# Altium footprint library klp.PcbLib: 436 footprints (part 15 of 28)
Each footprint in its own frame and in the unit in brackets; x right, y up, seen from the top. Pads: shape width x height; smd on the part's side, far side on the other; paste and mask are expansions set on the pad; w line width, h text height; cw(c..) or ccw(c..) is an arc to the next point about the centre after c.
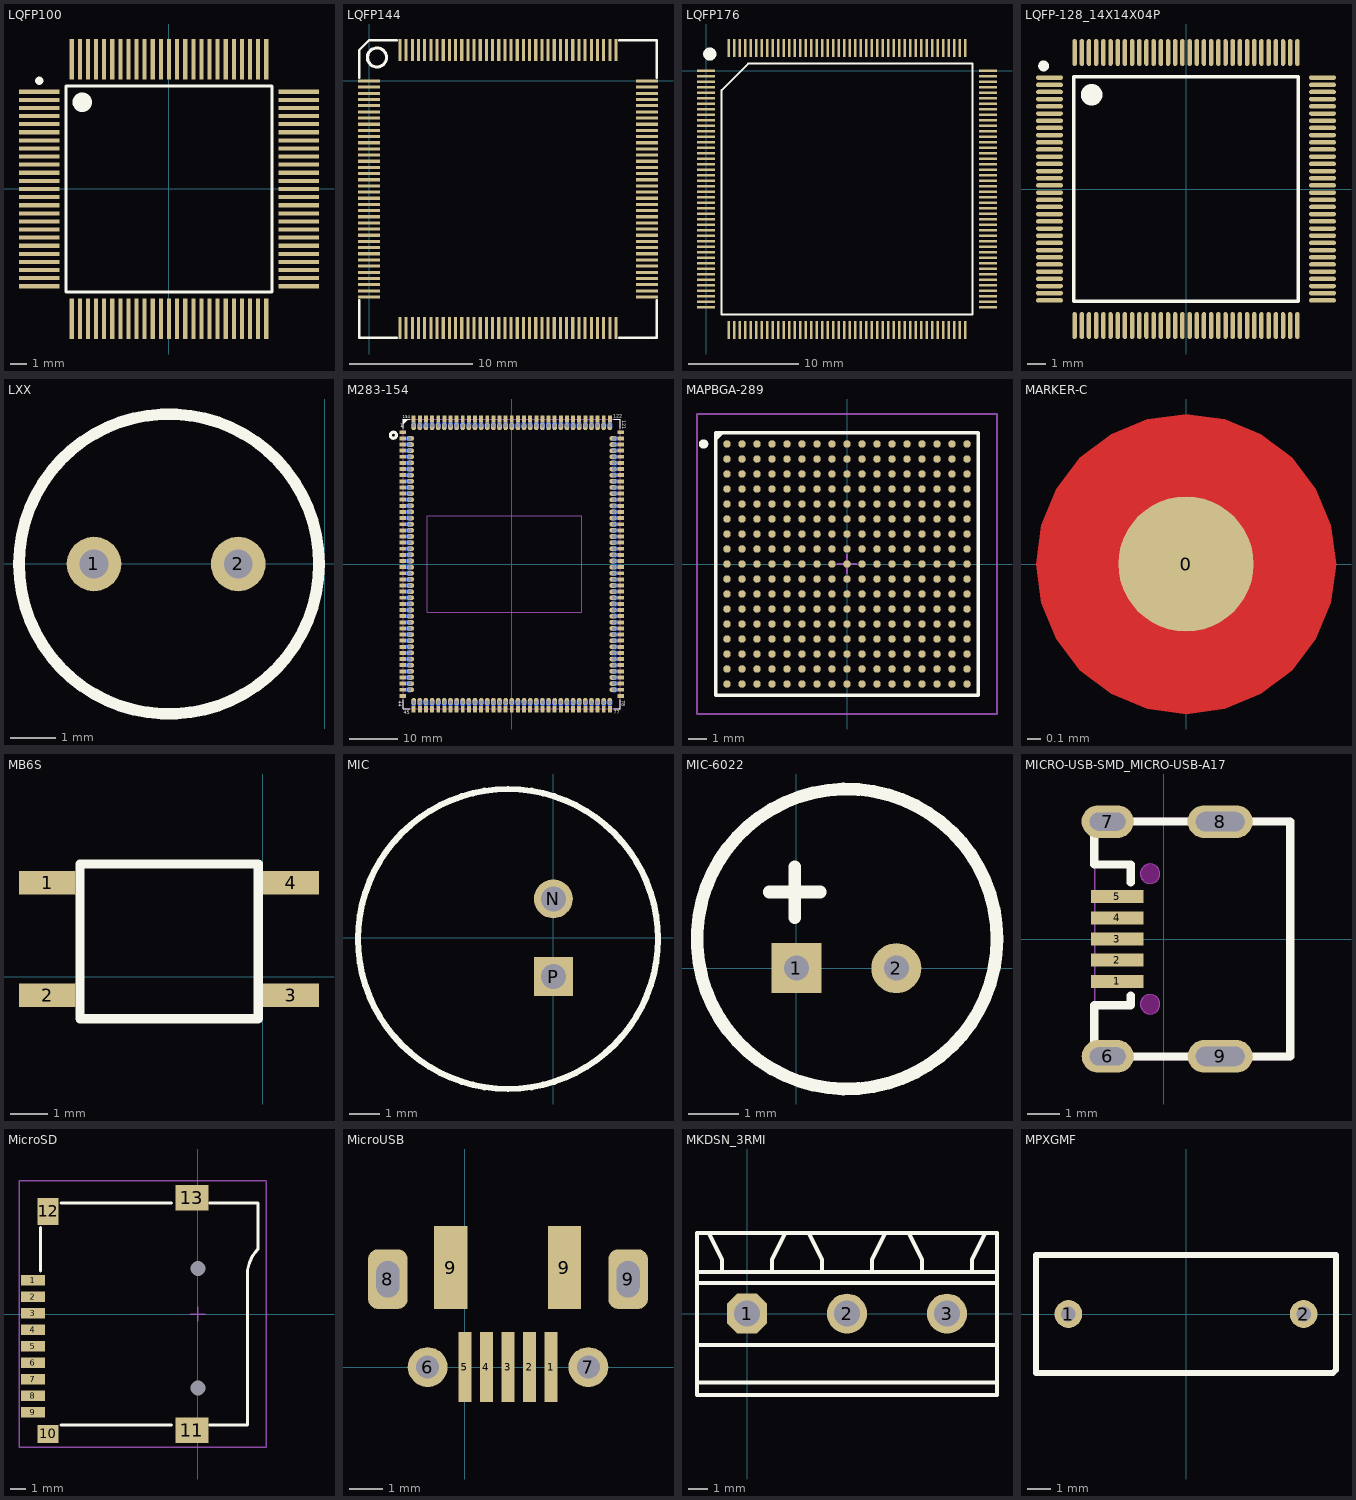
[diagram p14: the footprints below, top view; thin cyan lines are the x and y axes]

## LQFP100 [mm] "TSQFP, 100-Leads, Body 16.0x16.0mm (max), Pitch 0.50mm, IPC Medium Density"
height 1.5
pads (100):
  rect 2.5x0.254 smd: 1(-8,6) 2(-8,5.5) 3(-8,5) 4(-8,4.5) 5(-8,4) 6(-8,3.5) 7(-8,3) 8(-8,2.5) 9(-8,2) 10(-8,1.5) 11(-8,1) 12(-8,0.5) 13(-8,0) 14(-8,-0.5) 15(-8,-1) 16(-8,-1.5) 17(-8,-2) 18(-8,-2.5) 19(-8,-3) 20(-8,-3.5) 21(-8,-4) 22(-8,-4.5) 23(-8,-5) 24(-8,-5.5) 25(-8,-6) 51(8,-6) 52(8,-5.5) 53(8,-5) 54(8,-4.5) 55(8,-4) 56(8,-3.5) 57(8,-3) 58(8,-2.5) 59(8,-2) 60(8,-1.5) 61(8,-1) 62(8,-0.5) 63(8,0) 64(8,0.5) 65(8,1) 66(8,1.5) 67(8,2) 68(8,2.5) 69(8,3) 70(8,3.5) 71(8,4) 72(8,4.5) 73(8,5) 74(8,5.5) 75(8,6)
  rect 0.254x2.5 smd: 26(-6,-8) 27(-5.5,-8) 28(-5,-8) 29(-4.5,-8) 30(-4,-8) 31(-3.5,-8) 32(-3,-8) 33(-2.5,-8) 34(-2,-8) 35(-1.5,-8) 36(-1,-8) 37(-0.5,-8) 38(0,-8) 39(0.5,-8) 40(1,-8) 41(1.5,-8) 42(2,-8) 43(2.5,-8) 44(3,-8) 45(3.5,-8) 46(4,-8) 47(4.5,-8) 48(5,-8) 49(5.5,-8) 50(6,-8) 76(6,8) 77(5.5,8) 78(5,8) 79(4.5,8) 80(4,8) 81(3.5,8) 82(3,8) 83(2.5,8) 84(2,8) 85(1.5,8) 86(1,8) 87(0.5,8) 88(0,8) 89(-0.5,8) 90(-1,8) 91(-1.5,8) 92(-2,8) 93(-2.5,8) 94(-3,8) 95(-3.5,8) 96(-4,8) 97(-4.5,8) 98(-5,8) 99(-5.5,8) 100(-6,8)
Top Overlay:
  circle w0.6: c-5.35,5.35 r0.3
  circle w0.25: c-8,6.675 r0.125
  lines w0.2: -6.35,-6.35 6.35,-6.35 6.35,6.35 -6.35,6.35 -6.35,-6.35

## LQFP144 [mm]
pads (144):
  rect 1.8x0.254 smd: 1(-0.009,0.001) 2(-0.009,-0.499) 3(-0.009,-0.999) 4(-0.009,-1.499) 5(-0.009,-1.999) 6(-0.009,-2.499) 7(-0.009,-2.999) 8(-0.009,-3.499) 9(-0.009,-3.999) 10(-0.009,-4.499) 11(-0.009,-4.999) 12(-0.009,-5.499) 13(-0.009,-5.999) 14(-0.009,-6.499) 15(-0.009,-6.999) 16(-0.009,-7.499) 17(-0.009,-7.999) 18(-0.009,-8.499) 19(-0.009,-8.999) 20(-0.009,-9.499) 21(-0.009,-9.999) 22(-0.009,-10.499) 23(-0.009,-10.999) 24(-0.009,-11.499) 25(-0.009,-11.999) 26(-0.009,-12.499) 27(-0.009,-12.999) 28(-0.009,-13.499) 29(-0.009,-13.999) 30(-0.009,-14.499) 31(-0.009,-14.999) 32(-0.009,-15.499) 33(-0.009,-15.999) 34(-0.009,-16.499) 35(-0.009,-16.999) 36(-0.009,-17.499) 73(22.491,-17.499) 74(22.491,-16.999) 75(22.491,-16.499) 76(22.491,-15.999) 77(22.491,-15.499) 78(22.491,-14.999) 79(22.491,-14.499) 80(22.491,-13.999) 81(22.491,-13.499) 82(22.491,-12.999) 83(22.491,-12.499) 84(22.491,-11.999) 85(22.491,-11.499) 86(22.491,-10.999) 87(22.491,-10.499) 88(22.491,-9.999) 89(22.491,-9.499) 90(22.491,-8.999) 91(22.491,-8.499) 92(22.491,-7.999) 93(22.491,-7.499) 94(22.491,-6.999) 95(22.491,-6.499) 96(22.491,-5.999) 97(22.491,-5.499) 98(22.491,-4.999) 99(22.491,-4.499) 100(22.491,-3.999) 101(22.491,-3.499) 102(22.491,-2.999) 103(22.491,-2.499) 104(22.491,-1.999) 105(22.491,-1.499) 106(22.491,-0.999) 107(22.491,-0.499) 108(22.491,0.001)
  rect 0.254x1.8 smd: 37(2.491,-19.999) 38(2.991,-19.999) 39(3.491,-19.999) 40(3.991,-19.999) 41(4.491,-19.999) 42(4.991,-19.999) 43(5.491,-19.999) 44(5.991,-19.999) 45(6.491,-19.999) 46(6.991,-19.999) 47(7.491,-19.999) 48(7.991,-19.999) 49(8.491,-19.999) 50(8.991,-19.999) 51(9.491,-19.999) 52(9.991,-19.999) 53(10.491,-19.999) 54(10.991,-19.999) 55(11.491,-19.999) 56(11.991,-19.999) 57(12.491,-19.999) 58(12.991,-19.999) 59(13.491,-19.999) 60(13.991,-19.999) 61(14.491,-19.999) 62(14.991,-19.999) 63(15.491,-19.999) 64(15.991,-19.999) 65(16.491,-19.999) 66(16.991,-19.999) 67(17.491,-19.999) 68(17.991,-19.999) 69(18.491,-19.999) 70(18.991,-19.999) 71(19.491,-19.999) 72(19.991,-19.999) 109(19.991,2.501) 110(19.491,2.501) 111(18.991,2.501) 112(18.491,2.501) 113(17.991,2.501) 114(17.491,2.501) 115(16.991,2.501) 116(16.491,2.501) 117(15.991,2.501) 118(15.491,2.501) 119(14.991,2.501) 120(14.491,2.501) 121(13.991,2.501) 122(13.491,2.501) 123(12.991,2.501) 124(12.491,2.501) 125(11.991,2.501) 126(11.491,2.501) 127(10.991,2.501) 128(10.491,2.501) 129(9.991,2.501) 130(9.491,2.501) 131(8.991,2.501) 132(8.491,2.501) 133(7.991,2.501) 134(7.491,2.501) 135(6.991,2.501) 136(6.491,2.501) 137(5.991,2.501) 138(5.491,2.501) 139(4.991,2.501) 140(4.491,2.501) 141(3.991,2.501) 142(3.491,2.501) 143(2.991,2.501) 144(2.491,2.501)
Top Overlay:
  circle w0.254: c0.624,1.905 r0.773
  lines w0.2: -0.809,-17.749 -0.809,-20.799 2.241,-20.799 ; -0.809,0.251 -0.809,2.501 -0.009,3.301 2.241,3.301 ; 20.241,-20.799 23.291,-20.799 23.291,-17.749 ; 20.241,3.301 23.291,3.301 23.291,0.251

## LQFP176 [mm]
pads (176):
  rect 1.65x0.254 smd: 1(0,0) 2(0,-0.5) 3(0,-1) 4(0,-1.5) 5(0,-2) 6(0,-2.5) 7(0,-3) 8(0,-3.5) 9(0,-4) 10(0,-4.5) 11(0,-5) 12(0,-5.5) 13(0,-6) 14(0,-6.5) 15(0,-7) 16(0,-7.5) 17(0,-8) 18(0,-8.5) 19(0,-9) 20(0,-9.5) 21(0,-10) 22(0,-10.5) 23(0,-11) 24(0,-11.5) 25(0,-12) 26(0,-12.5) 27(0,-13) 28(0,-13.5) 29(0,-14) 30(0,-14.5) 31(0,-15) 32(0,-15.5) 33(0,-16) 34(0,-16.5) 35(0,-17) 36(0,-17.5) 37(0,-18) 38(0,-18.5) 39(0,-19) 40(0,-19.5) 41(0,-20) 42(0,-20.5) 43(0,-21) 44(0,-21.5) 89(25.631,-21.5) 90(25.631,-21) 91(25.631,-20.5) 92(25.631,-20) 93(25.631,-19.5) 94(25.631,-19) 95(25.631,-18.5) 96(25.631,-18) 97(25.631,-17.5) 98(25.631,-17) 99(25.631,-16.5) 100(25.631,-16) 101(25.631,-15.5) 102(25.631,-15) 103(25.631,-14.5) 104(25.631,-14) 105(25.631,-13.5) 106(25.631,-13) 107(25.631,-12.5) 108(25.631,-12) 109(25.631,-11.5) 110(25.631,-11) 111(25.631,-10.5) 112(25.631,-10) 113(25.631,-9.5) 114(25.631,-9) 115(25.631,-8.5) 116(25.631,-8) 117(25.631,-7.5) 118(25.631,-7) 119(25.631,-6.5) 120(25.631,-6) 121(25.631,-5.5) 122(25.631,-5) 123(25.631,-4.5) 124(25.631,-4) 125(25.631,-3.5) 126(25.631,-3) 127(25.631,-2.5) 128(25.631,-2) 129(25.631,-1.5) 130(25.631,-1) 131(25.631,-0.5) 132(25.631,0)
  rect 0.254x1.65 smd: 45(2.065,-23.566) 46(2.566,-23.566) 47(3.066,-23.566) 48(3.565,-23.566) 49(4.066,-23.566) 50(4.565,-23.566) 51(5.066,-23.566) 52(5.565,-23.566) 53(6.066,-23.566) 54(6.565,-23.566) 55(7.066,-23.566) 56(7.565,-23.566) 57(8.066,-23.566) 58(8.565,-23.566) 59(9.066,-23.566) 60(9.565,-23.566) 61(10.066,-23.566) 62(10.565,-23.566) 63(11.066,-23.566) 64(11.565,-23.566) 65(12.066,-23.566) 66(12.565,-23.566) 67(13.066,-23.566) 68(13.565,-23.566) 69(14.066,-23.566) 70(14.565,-23.566) 71(15.066,-23.566) 72(15.566,-23.566) 73(16.066,-23.566) 74(16.566,-23.566) 75(17.065,-23.566) 76(17.566,-23.566) 77(18.065,-23.566) 78(18.566,-23.566) 79(19.065,-23.566) 80(19.566,-23.566) 81(20.065,-23.566) 82(20.566,-23.566) 83(21.065,-23.566) 84(21.566,-23.566) 85(22.065,-23.566) 86(22.566,-23.566) 87(23.065,-23.566) 88(23.566,-23.566) 133(23.566,2.065) 134(23.065,2.065) 135(22.566,2.065) 136(22.065,2.065) 137(21.566,2.065) 138(21.065,2.065) 139(20.566,2.065) 140(20.065,2.065) 141(19.566,2.065) 142(19.065,2.065) 143(18.566,2.065) 144(18.065,2.065) 145(17.566,2.065) 146(17.065,2.065) 147(16.566,2.065) 148(16.066,2.065) 149(15.566,2.065) 150(15.066,2.065) 151(14.565,2.065) 152(14.066,2.065) 153(13.565,2.065) 154(13.066,2.065) 155(12.565,2.065) 156(12.066,2.065) 157(11.565,2.065) 158(11.066,2.065) 159(10.565,2.065) 160(10.066,2.065) 161(9.565,2.065) 162(9.066,2.065) 163(8.565,2.065) 164(8.066,2.065) 165(7.565,2.065) 166(7.066,2.065) 167(6.565,2.065) 168(6.066,2.065) 169(5.565,2.065) 170(5.066,2.065) 171(4.565,2.065) 172(4.066,2.065) 173(3.565,2.065) 174(3.066,2.065) 175(2.566,2.065) 176(2.065,2.065)
Top Overlay:
  circle w0.6: c0.335,1.524 r0.3
  lines w0.2: 1.415,-22.15 1.415,-1.76 3.825,0.65 24.215,0.65 24.215,-22.15 1.415,-22.15

## LQFP-128_14X14X04P [mm]
pads (128):
  oval 1.5x0.25 smd: 1(-7.6,6.2) 2(-7.6,5.799) 3(-7.6,5.4) 4(-7.6,5.001) 5(-7.6,4.6) 6(-7.6,4.201) 7(-7.6,3.8) 8(-7.6,3.401) 9(-7.6,3) 10(-7.6,2.601) 11(-7.6,2.2) 12(-7.6,1.801) 13(-7.6,1.4) 14(-7.6,1.001) 15(-7.6,0.599) 16(-7.6,0.201) 17(-7.6,-0.201) 18(-7.6,-0.599) 19(-7.6,-1.001) 20(-7.6,-1.4) 21(-7.6,-1.801) 22(-7.6,-2.2) 23(-7.6,-2.601) 24(-7.6,-3) 25(-7.6,-3.401) 26(-7.6,-3.8) 27(-7.6,-4.201) 28(-7.6,-4.6) 29(-7.6,-5.001) 30(-7.6,-5.4) 31(-7.6,-5.799) 32(-7.6,-6.2) 65(7.6,-6.2) 66(7.6,-5.799) 67(7.6,-5.4) 68(7.6,-5.001) 69(7.6,-4.6) 70(7.6,-4.201) 71(7.6,-3.8) 72(7.6,-3.401) 73(7.6,-3) 74(7.6,-2.601) 75(7.6,-2.2) 76(7.6,-1.801) 77(7.6,-1.4) 78(7.6,-1.001) 79(7.6,-0.599) 80(7.6,-0.201) 81(7.6,0.201) 82(7.6,0.599) 83(7.6,1.001) 84(7.6,1.4) 85(7.6,1.801) 86(7.6,2.2) 87(7.6,2.601) 88(7.6,3) 89(7.6,3.401) 90(7.6,3.8) 91(7.6,4.201) 92(7.6,4.6) 93(7.6,5.001) 94(7.6,5.4) 95(7.6,5.799) 96(7.6,6.2)
  oval 0.25x1.5 smd: 33(-6.2,-7.6) 34(-5.799,-7.6) 35(-5.4,-7.6) 36(-5.001,-7.6) 37(-4.6,-7.6) 38(-4.201,-7.6) 39(-3.8,-7.6) 40(-3.401,-7.6) 41(-3,-7.6) 42(-2.601,-7.6) 43(-2.2,-7.6) 44(-1.801,-7.6) 45(-1.4,-7.6) 46(-1.001,-7.6) 47(-0.599,-7.6) 48(-0.201,-7.6) 49(0.201,-7.6) 50(0.599,-7.6) 51(1.001,-7.6) 52(1.4,-7.6) 53(1.801,-7.6) 54(2.2,-7.6) 55(2.601,-7.6) 56(3,-7.6) 57(3.401,-7.6) 58(3.8,-7.6) 59(4.201,-7.6) 60(4.6,-7.6) 61(5.001,-7.6) 62(5.4,-7.6) 63(5.799,-7.6) 64(6.2,-7.6) 97(6.2,7.6) 98(5.799,7.6) 99(5.4,7.6) 100(5.001,7.6) 101(4.6,7.6) 102(4.201,7.6) 103(3.8,7.6) 104(3.401,7.6) 105(3,7.6) 106(2.601,7.6) 107(2.2,7.6) 108(1.801,7.6) 109(1.4,7.6) 110(1.001,7.6) 111(0.599,7.6) 112(0.201,7.6) 113(-0.201,7.6) 114(-0.599,7.6) 115(-1.001,7.6) 116(-1.4,7.6) 117(-1.801,7.6) 118(-2.2,7.6) 119(-2.601,7.6) 120(-3,7.6) 121(-3.401,7.6) 122(-3.8,7.6) 123(-4.201,7.6) 124(-4.6,7.6) 125(-5.001,7.6) 126(-5.4,7.6) 127(-5.799,7.6) 128(-6.2,7.6)
Top Overlay:
  lines w0.2: -6.25,-6.25 6.25,-6.25 6.25,6.25 -6.25,6.25 -6.25,-6.25
  lines w0.3: -7.775,6.848 cw(c-7.925,6.849) -7.775,6.85
  lines w0.6: -4.95,5.245 cw(c-5.25,5.248) -4.95,5.25

## LXX [mm]
height 10
pads (2):
  round 1.2 hole 0.635: 1(-5.08,0) 2(-1.905,0)
Top Overlay:
  circle w0.254: c-3.429,0 r3.302

## M283-154 [mm]
pads (604):
  rect 1.384x0.813 smd mask+0.051: 1(-22.57,27.305) 2(-22.57,26.035) 3(-22.57,24.765) 4(-22.57,23.495) 5(-22.57,22.225) 6(-22.57,20.955) 7(-22.57,19.685) 8(-22.57,18.415) 9(-22.57,17.145) 10(-22.57,15.875) 11(-22.57,14.605) 12(-22.57,13.335) 13(-22.57,12.065) 14(-22.57,10.795) 15(-22.57,9.525) 16(-22.57,8.255) 17(-22.57,6.985) 18(-22.57,5.715) 19(-22.57,4.445) 20(-22.57,3.175) 21(-22.57,1.905) 22(-22.57,0.635) 23(-22.57,-0.635) 24(-22.57,-1.905) 25(-22.57,-3.175) 26(-22.57,-4.445) 27(-22.57,-5.715) 28(-22.57,-6.985) 29(-22.57,-8.255) 30(-22.57,-9.525) 31(-22.57,-10.795) 32(-22.57,-12.065) 33(-22.57,-13.335) 34(-22.57,-14.605) 35(-22.57,-15.875) 36(-22.57,-17.145) 37(-22.57,-18.415) 38(-22.57,-19.685) 39(-22.57,-20.955) 40(-22.57,-22.225) 41(-22.57,-23.495) 42(-22.57,-24.765) 43(-22.57,-26.035) 44(-22.57,-27.305) 78(22.57,-27.305) 79(22.57,-26.035) 80(22.57,-24.765) 81(22.57,-23.495) 82(22.57,-22.225) 83(22.57,-20.955) 84(22.57,-19.685) 85(22.57,-18.415) 86(22.57,-17.145) 87(22.57,-15.875) 88(22.57,-14.605) 89(22.57,-13.335) 90(22.57,-12.065) 91(22.57,-10.795) 92(22.57,-9.525) 93(22.57,-8.255) 94(22.57,-6.985) 95(22.57,-5.715) 96(22.57,-4.445) 97(22.57,-3.175) 98(22.57,-1.905) 99(22.57,-0.635) 100(22.57,0.635) 101(22.57,1.905) 102(22.57,3.175) 103(22.57,4.445) 104(22.57,5.715) 105(22.57,6.985) 106(22.57,8.255) 107(22.57,9.525) 108(22.57,10.795) 109(22.57,12.065) 110(22.57,13.335) 111(22.57,14.605) 112(22.57,15.875) 113(22.57,17.145) 114(22.57,18.415) 115(22.57,19.685) 116(22.57,20.955) 117(22.57,22.225) 118(22.57,23.495) 119(22.57,24.765) 120(22.57,26.035) 121(22.57,27.305)
  oval 1x0.94 hole 0.8 mask+0.051: 2(-21.179,26.035) 3(-21.179,24.765) 4(-21.179,23.495) 5(-21.179,22.225) 6(-21.179,20.955) 7(-21.179,19.685) 8(-21.179,18.415) 9(-21.179,17.145) 10(-21.179,15.875) 11(-21.179,14.605) 12(-21.179,13.335) 13(-21.179,12.065) 14(-21.179,10.795) 15(-21.179,9.525) 16(-21.179,8.255) 17(-21.179,6.985) 18(-21.179,5.715) 19(-21.179,4.445) 20(-21.179,3.175) 21(-21.179,1.905) 22(-21.179,0.635) 23(-21.179,-0.635) 24(-21.179,-1.905) 25(-21.179,-3.175) 26(-21.179,-4.445) 27(-21.179,-5.715) 28(-21.179,-6.985) 29(-21.179,-8.255) 30(-21.179,-9.525) 31(-21.179,-10.795) 32(-21.179,-12.065) 33(-21.179,-13.335) 34(-21.179,-14.605) 35(-21.179,-15.875) 36(-21.179,-17.145) 37(-21.179,-18.415) 38(-21.179,-19.685) 39(-21.179,-20.955) 40(-21.179,-22.225) 41(-21.179,-23.495) 42(-21.179,-24.765) 43(-21.179,-26.035) 79(21.179,-26.035) 80(21.179,-24.765) 81(21.179,-23.495) 82(21.179,-22.225) 83(21.179,-20.955) 84(21.179,-19.685) 85(21.179,-18.415) 86(21.179,-17.145) 87(21.179,-15.875) 88(21.179,-14.605) 89(21.179,-13.335) 90(21.179,-12.065) 91(21.179,-10.795) 92(21.179,-9.525) 93(21.179,-8.255) 94(21.179,-6.985) 95(21.179,-5.715) 96(21.179,-4.445) 97(21.179,-3.175) 98(21.179,-1.905) 99(21.179,-0.635) 100(21.179,0.635) 101(21.179,1.905) 102(21.179,3.175) 103(21.179,4.445) 104(21.179,5.715) 105(21.179,6.985) 106(21.179,8.255) 107(21.179,9.525) 108(21.179,10.795) 109(21.179,12.065) 110(21.179,13.335) 111(21.179,14.605) 112(21.179,15.875) 113(21.179,17.145) 114(21.179,18.415) 115(21.179,19.685) 116(21.179,20.955) 117(21.179,22.225) 118(21.179,23.495) 119(21.179,24.765) 120(21.179,26.035)
  oval 1.5x0.95 smd far side mask+0.051: 2(-21.179,26.035) 3(-21.179,24.765) 4(-21.179,23.495) 5(-21.179,22.225) 6(-21.179,20.955) 7(-21.179,19.685) 8(-21.179,18.415) 9(-21.179,17.145) 10(-21.179,15.875) 11(-21.179,14.605) 12(-21.179,13.335) 13(-21.179,12.065) 14(-21.179,10.795) 15(-21.179,9.525) 16(-21.179,8.255) 17(-21.179,6.985) 18(-21.179,5.715) 19(-21.179,4.445) 20(-21.179,3.175) 21(-21.179,1.905) 22(-21.179,0.635) 23(-21.179,-0.635) 24(-21.179,-1.905) 25(-21.179,-3.175) 26(-21.179,-4.445) 27(-21.179,-5.715) 28(-21.179,-6.985) 29(-21.179,-8.255) 30(-21.179,-9.525) 31(-21.179,-10.795) 32(-21.179,-12.065) 33(-21.179,-13.335) 34(-21.179,-14.605) 35(-21.179,-15.875) 36(-21.179,-17.145) 37(-21.179,-18.415) 38(-21.179,-19.685) 39(-21.179,-20.955) 40(-21.179,-22.225) 41(-21.179,-23.495) 42(-21.179,-24.765) 43(-21.179,-26.035) 79(21.179,-26.035) 80(21.179,-24.765) 81(21.179,-23.495) 82(21.179,-22.225) 83(21.179,-20.955) 84(21.179,-19.685) 85(21.179,-18.415) 86(21.179,-17.145) 87(21.179,-15.875) 88(21.179,-14.605) 89(21.179,-13.335) 90(21.179,-12.065) 91(21.179,-10.795) 92(21.179,-9.525) 93(21.179,-8.255) 94(21.179,-6.985) 95(21.179,-5.715) 96(21.179,-4.445) 97(21.179,-3.175) 98(21.179,-1.905) 99(21.179,-0.635) 100(21.179,0.635) 101(21.179,1.905) 102(21.179,3.175) 103(21.179,4.445) 104(21.179,5.715) 105(21.179,6.985) 106(21.179,8.255) 107(21.179,9.525) 108(21.179,10.795) 109(21.179,12.065) 110(21.179,13.335) 111(21.179,14.605) 112(21.179,15.875) 113(21.179,17.145) 114(21.179,18.415) 115(21.179,19.685) 116(21.179,20.955) 117(21.179,22.225) 118(21.179,23.495) 119(21.179,24.765) 120(21.179,26.035)
  oval 1.5x0.95 smd mask+0.051: 2(-20.976,26.035) 3(-20.976,24.765) 4(-20.976,23.495) 5(-20.976,22.225) 6(-20.976,20.955) 7(-20.976,19.685) 8(-20.976,18.415) 9(-20.976,17.145) 10(-20.976,15.875) 11(-20.976,14.605) 12(-20.976,13.335) 13(-20.976,12.065) 14(-20.976,10.795) 15(-20.976,9.525) 16(-20.976,8.255) 17(-20.976,6.985) 18(-20.976,5.715) 19(-20.976,4.445) 20(-20.976,3.175) 21(-20.976,1.905) 22(-20.976,0.635) 23(-20.976,-0.635) 24(-20.976,-1.905) 25(-20.976,-3.175) 26(-20.976,-4.445) 27(-20.976,-5.715) 28(-20.976,-6.985) 29(-20.976,-8.255) 30(-20.976,-9.525) 31(-20.976,-10.795) 32(-20.976,-12.065) 33(-20.976,-13.335) 34(-20.976,-14.605) 35(-20.976,-15.875) 36(-20.976,-17.145) 37(-20.976,-18.415) 38(-20.976,-19.685) 39(-20.976,-20.955) 40(-20.976,-22.225) 41(-20.976,-23.495) 42(-20.976,-24.765) 43(-20.976,-26.035) 79(20.976,-26.035) 80(20.976,-24.765) 81(20.976,-23.495) 82(20.976,-22.225) 83(20.976,-20.955) 84(20.976,-19.685) 85(20.976,-18.415) 86(20.976,-17.145) 87(20.976,-15.875) 88(20.976,-14.605) 89(20.976,-13.335) 90(20.976,-12.065) 91(20.976,-10.795) 92(20.976,-9.525) 93(20.976,-8.255) 94(20.976,-6.985) 95(20.976,-5.715) 96(20.976,-4.445) 97(20.976,-3.175) 98(20.976,-1.905) 99(20.976,-0.635) 100(20.976,0.635) 101(20.976,1.905) 102(20.976,3.175) 103(20.976,4.445) 104(20.976,5.715) 105(20.976,6.985) 106(20.976,8.255) 107(20.976,9.525) 108(20.976,10.795) 109(20.976,12.065) 110(20.976,13.335) 111(20.976,14.605) 112(20.976,15.875) 113(20.976,17.145) 114(20.976,18.415) 115(20.976,19.685) 116(20.976,20.955) 117(20.976,22.225) 118(20.976,23.495) 119(20.976,24.765) 120(20.976,26.035)
  rect 0.813x1.384 smd mask+0.051: 45(-20.32,-30.07) 46(-19.05,-30.07) 47(-17.78,-30.07) 48(-16.51,-30.07) 49(-15.24,-30.07) 50(-13.97,-30.07) 51(-12.7,-30.07) 52(-11.43,-30.07) 53(-10.16,-30.07) 54(-8.89,-30.07) 55(-7.62,-30.07) 56(-6.35,-30.07) 57(-5.08,-30.07) 58(-3.81,-30.07) 59(-2.54,-30.07) 60(-1.27,-30.07) 61(0,-30.07) 62(1.27,-30.07) 63(2.54,-30.07) 64(3.81,-30.07) 65(5.08,-30.07) 66(6.35,-30.07) 67(7.62,-30.07) 68(8.89,-30.07) 69(10.16,-30.07) 70(11.43,-30.07) 71(12.7,-30.07) 72(13.97,-30.07) 73(15.24,-30.07) 74(16.51,-30.07) 75(17.78,-30.07) 76(19.05,-30.07) 77(20.32,-30.07) 122(20.32,30.07) 123(19.05,30.07) 124(17.78,30.07) 125(16.51,30.07) 126(15.24,30.07) 127(13.97,30.07) 128(12.7,30.07) 129(11.43,30.07) 130(10.16,30.07) 131(8.89,30.07) 132(7.62,30.07) 133(6.35,30.07) 134(5.08,30.07) 135(3.81,30.07) 136(2.54,30.07) 137(1.27,30.07) 138(0,30.07) 139(-1.27,30.07) 140(-2.54,30.07) 141(-3.81,30.07) 142(-5.08,30.07) 143(-6.35,30.07) 144(-7.62,30.07) 145(-8.89,30.07) 146(-10.16,30.07) 147(-11.43,30.07) 148(-12.7,30.07) 149(-13.97,30.07) 150(-15.24,30.07) 151(-16.51,30.07) 152(-17.78,30.07) 153(-19.05,30.07) 154(-20.32,30.07)
  oval 0.95x1 hole 0.8 mask+0.051: 45(-20.32,-28.679)
  oval 0.95x1.5 smd far side mask+0.051: 45(-20.32,-28.679) 46(-19.05,-28.679) 47(-17.78,-28.679) 48(-16.51,-28.679) 49(-15.24,-28.679) 50(-13.97,-28.679) 51(-12.7,-28.679) 52(-11.43,-28.679) 53(-10.16,-28.679) 54(-8.89,-28.679) 55(-7.62,-28.679) 56(-6.35,-28.679) 57(-5.08,-28.679) 58(-3.81,-28.679) 59(-2.54,-28.679) 60(-1.27,-28.679) 61(0,-28.679) 62(1.27,-28.679) 63(2.54,-28.679) 64(3.81,-28.679) 65(5.08,-28.679) 66(6.35,-28.679) 67(7.62,-28.679) 68(8.89,-28.679) 69(10.16,-28.679) 70(11.43,-28.679) 71(12.7,-28.679) 72(13.97,-28.679) 73(15.24,-28.679) 74(16.51,-28.679) 75(17.78,-28.679) 76(19.05,-28.679) 77(20.32,-28.679) 122(20.32,28.679) 123(19.05,28.679) 124(17.78,28.679) 125(16.51,28.679) 126(15.24,28.679) 127(13.97,28.679) 128(12.7,28.679) 129(11.43,28.679) 130(10.16,28.679) 131(8.89,28.679) 132(7.62,28.679) 133(6.35,28.679) 134(5.08,28.679) 135(3.81,28.679) 136(2.54,28.679) 137(1.27,28.679) 138(0,28.679) 139(-1.27,28.679) 140(-2.54,28.679) 141(-3.81,28.679) 142(-5.08,28.679) 143(-6.35,28.679) 144(-7.62,28.679) 145(-8.89,28.679) 146(-10.16,28.679) 147(-11.43,28.679) 148(-12.7,28.679) 149(-13.97,28.679) 150(-15.24,28.679) 151(-16.51,28.679) 152(-17.78,28.679) 153(-19.05,28.679) 154(-20.32,28.679)
  oval 0.95x1.5 smd mask+0.051: 45(-20.32,-28.476) 46(-19.05,-28.476) 47(-17.78,-28.476) 48(-16.51,-28.476) 49(-15.24,-28.476) 50(-13.97,-28.476) 51(-12.7,-28.476) 52(-11.43,-28.476) 53(-10.16,-28.476) 54(-8.89,-28.476) 55(-7.62,-28.476) 56(-6.35,-28.476) 57(-5.08,-28.476) 58(-3.81,-28.476) 59(-2.54,-28.476) 60(-1.27,-28.476) 61(0,-28.476) 62(1.27,-28.476) 63(2.54,-28.476) 64(3.81,-28.476) 65(5.08,-28.476) 66(6.35,-28.476) 67(7.62,-28.476) 68(8.89,-28.476) 69(10.16,-28.476) 70(11.43,-28.476) 71(12.7,-28.476) 72(13.97,-28.476) 73(15.24,-28.476) 74(16.51,-28.476) 75(17.78,-28.476) 76(19.05,-28.476) 77(20.32,-28.476) 122(20.32,28.476) 123(19.05,28.476) 124(17.78,28.476) 125(16.51,28.476) 126(15.24,28.476) 127(13.97,28.476) 128(12.7,28.476) 129(11.43,28.476) 130(10.16,28.476) 131(8.89,28.476) 132(7.62,28.476) 133(6.35,28.476) 134(5.08,28.476) 135(3.81,28.476) 136(2.54,28.476) 137(1.27,28.476) 138(0,28.476) 139(-1.27,28.476) 140(-2.54,28.476) 141(-3.81,28.476) 142(-5.08,28.476) 143(-6.35,28.476) 144(-7.62,28.476) 145(-8.89,28.476) 146(-10.16,28.476) 147(-11.43,28.476) 148(-12.7,28.476) 149(-13.97,28.476) 150(-15.24,28.476) 151(-16.51,28.476) 152(-17.78,28.476) 153(-19.05,28.476) 154(-20.32,28.476)
  oval 0.94x1 hole 0.8 mask+0.051: 46(-19.05,-28.679) 47(-17.78,-28.679) 48(-16.51,-28.679) 49(-15.24,-28.679) 50(-13.97,-28.679) 51(-12.7,-28.679) 52(-11.43,-28.679) 53(-10.16,-28.679) 54(-8.89,-28.679) 55(-7.62,-28.679) 56(-6.35,-28.679) 57(-5.08,-28.679) 58(-3.81,-28.679) 59(-2.54,-28.679) 60(-1.27,-28.679) 61(0,-28.679) 62(1.27,-28.679) 63(2.54,-28.679) 64(3.81,-28.679) 65(5.08,-28.679) 66(6.35,-28.679) 67(7.62,-28.679) 68(8.89,-28.679) 69(10.16,-28.679) 70(11.43,-28.679) 71(12.7,-28.679) 72(13.97,-28.679) 73(15.24,-28.679) 74(16.51,-28.679) 75(17.78,-28.679) 76(19.05,-28.679) 77(20.32,-28.679) 122(20.32,28.679) 123(19.05,28.679) 124(17.78,28.679) 125(16.51,28.679) 126(15.24,28.679) 127(13.97,28.679) 128(12.7,28.679) 129(11.43,28.679) 130(10.16,28.679) 131(8.89,28.679) 132(7.62,28.679) 133(6.35,28.679) 134(5.08,28.679) 135(3.81,28.679) 136(2.54,28.679) 137(1.27,28.679) 138(0,28.679) 139(-1.27,28.679) 140(-2.54,28.679) 141(-3.81,28.679) 142(-5.08,28.679) 143(-6.35,28.679) 144(-7.62,28.679) 145(-8.89,28.679) 146(-10.16,28.679) 147(-11.43,28.679) 148(-12.7,28.679) 149(-13.97,28.679) 150(-15.24,28.679) 151(-16.51,28.679) 152(-17.78,28.679) 153(-19.05,28.679) 154(-20.32,28.679)
Top Overlay:
  circle w0.635: c-24.532,26.695 r0.635
  region: -22.5,30 -21.488,30 -22.5,28.988
  lines w0.127: -22.5,-28.092 -22.5,-30 -21.107,-30 ; -22.5,28.092 -22.5,30 -21.107,30 ; 21.107,-30 22.5,-30 22.5,-28.092 ; 21.107,30 22.5,30 22.5,28.092
  text "44" at -23.489,-28.292 h0.76
  text "45" at -22.428,-31.064 h0.76
  text "77" at 21.082,-30.988 h0.76
  text "78" at 22.824,-28.246 h0.76
  text "121" at 22.84,29.744 h0.76
  text "122" at 21.006,30.328 h0.76
  text "1" at -23.089,28.321 h0.76
  text "154" at -22.581,30.251 h0.64
Mechanical 1:
  lines w0.127: -17.5,-10 -17.5,10 14.5,10 14.5,-10 -17.5,-10
Mechanical 2:
  lines w0.127: -17.5,-10 14.5,-10 14.5,10 -17.5,10 -17.5,-10
Mechanical 15:
  lines w0.127: -22.5,-30 22.5,-30 22.5,30 -22.5,30 -22.5,-30

## MAPBGA-289 [mm]
pads (289):
  round 0.4 smd: A1(-6.4,6.4) A2(-5.6,6.4) A3(-4.8,6.4) A4(-4,6.4) A5(-3.2,6.4) A6(-2.4,6.4) A7(-1.6,6.4) A8(-0.8,6.4) A9(0,6.4) A10(0.8,6.4) A11(1.6,6.4) A12(2.4,6.4) A13(3.2,6.4) A14(4,6.4) A15(4.8,6.4) A16(5.6,6.4) A17(6.4,6.4) B1(-6.4,5.6) B2(-5.6,5.6) B3(-4.8,5.6) B4(-4,5.6) B5(-3.2,5.6) B6(-2.4,5.6) B7(-1.6,5.6) B8(-0.8,5.6) B9(0,5.6) B10(0.8,5.6) B11(1.6,5.6) B12(2.4,5.6) B13(3.2,5.6) B14(4,5.6) B15(4.8,5.6) B16(5.6,5.6) B17(6.4,5.6) C1(-6.4,4.8) C2(-5.6,4.8) C3(-4.8,4.8) C4(-4,4.8) C5(-3.2,4.8) C6(-2.4,4.8) C7(-1.6,4.8) C8(-0.8,4.8) C9(0,4.8) C10(0.8,4.8) C11(1.6,4.8) C12(2.4,4.8) C13(3.2,4.8) C14(4,4.8) C15(4.8,4.8) C16(5.6,4.8) C17(6.4,4.8) D1(-6.4,4) D2(-5.6,4) D3(-4.8,4) D4(-4,4) D5(-3.2,4) D6(-2.4,4) D7(-1.6,4) D8(-0.8,4) D9(0,4) D10(0.8,4) D11(1.6,4) D12(2.4,4) D13(3.2,4) D14(4,4) D15(4.8,4) D16(5.6,4) D17(6.4,4) E1(-6.4,3.2) E2(-5.6,3.2) E3(-4.8,3.2) E4(-4,3.2) E5(-3.2,3.2) E6(-2.4,3.2) E7(-1.6,3.2) E8(-0.8,3.2) E9(0,3.2) E10(0.8,3.2) E11(1.6,3.2) E12(2.4,3.2) E13(3.2,3.2) E14(4,3.2) E15(4.8,3.2) E16(5.6,3.2) E17(6.4,3.2) F1(-6.4,2.4) F2(-5.6,2.4) F3(-4.8,2.4) F4(-4,2.4) F5(-3.2,2.4) F6(-2.4,2.4) F7(-1.6,2.4) F8(-0.8,2.4) F9(0,2.4) F10(0.8,2.4) F11(1.6,2.4) F12(2.4,2.4) F13(3.2,2.4) F14(4,2.4) F15(4.8,2.4) F16(5.6,2.4) F17(6.4,2.4) G1(-6.4,1.6) G2(-5.6,1.6) G3(-4.8,1.6) G4(-4,1.6) G5(-3.2,1.6) G6(-2.4,1.6) G7(-1.6,1.6) G8(-0.8,1.6) G9(0,1.6) G10(0.8,1.6) G11(1.6,1.6) G12(2.4,1.6) G13(3.2,1.6) G14(4,1.6) G15(4.8,1.6) G16(5.6,1.6) G17(6.4,1.6) H1(-6.4,0.8) H2(-5.6,0.8) H3(-4.8,0.8) H4(-4,0.8) H5(-3.2,0.8) H6(-2.4,0.8) H7(-1.6,0.8) H8(-0.8,0.8) H9(0,0.8) H10(0.8,0.8) H11(1.6,0.8) H12(2.4,0.8) H13(3.2,0.8) H14(4,0.8) H15(4.8,0.8) H16(5.6,0.8) H17(6.4,0.8) J1(-6.4,0) J2(-5.6,0) J3(-4.8,0) J4(-4,0) J5(-3.2,0) J6(-2.4,0) J7(-1.6,0) J8(-0.8,0) J9(0,0) J10(0.8,0) J11(1.6,0) J12(2.4,0) J13(3.2,0) J14(4,0) J15(4.8,0) J16(5.6,0) J17(6.4,0) K1(-6.4,-0.8) K2(-5.6,-0.8) K3(-4.8,-0.8) K4(-4,-0.8) K5(-3.2,-0.8) K6(-2.4,-0.8) K7(-1.6,-0.8) K8(-0.8,-0.8) K9(0,-0.8) K10(0.8,-0.8) K11(1.6,-0.8) K12(2.4,-0.8) K13(3.2,-0.8) K14(4,-0.8) K15(4.8,-0.8) K16(5.6,-0.8) K17(6.4,-0.8) L1(-6.4,-1.6) L2(-5.6,-1.6) L3(-4.8,-1.6) L4(-4,-1.6) L5(-3.2,-1.6) L6(-2.4,-1.6) L7(-1.6,-1.6) L8(-0.8,-1.6) L9(0,-1.6) L10(0.8,-1.6) L11(1.6,-1.6) L12(2.4,-1.6) L13(3.2,-1.6) L14(4,-1.6) L15(4.8,-1.6) L16(5.6,-1.6) L17(6.4,-1.6) M1(-6.4,-2.4) M2(-5.6,-2.4) M3(-4.8,-2.4) M4(-4,-2.4) M5(-3.2,-2.4) M6(-2.4,-2.4) M7(-1.6,-2.4) M8(-0.8,-2.4) M9(0,-2.4) M10(0.8,-2.4) M11(1.6,-2.4) M12(2.4,-2.4) M13(3.2,-2.4) M14(4,-2.4) M15(4.8,-2.4) M16(5.6,-2.4) M17(6.4,-2.4) N1(-6.4,-3.2) N2(-5.6,-3.2) N3(-4.8,-3.2) N4(-4,-3.2) N5(-3.2,-3.2) N6(-2.4,-3.2) N7(-1.6,-3.2) N8(-0.8,-3.2) N9(0,-3.2) N10(0.8,-3.2) N11(1.6,-3.2) N12(2.4,-3.2) N13(3.2,-3.2) N14(4,-3.2) N15(4.8,-3.2) N16(5.6,-3.2) N17(6.4,-3.2) P1(-6.4,-4) P2(-5.6,-4) P3(-4.8,-4) P4(-4,-4) P5(-3.2,-4) P6(-2.4,-4) P7(-1.6,-4) P8(-0.8,-4) P9(0,-4) P10(0.8,-4) P11(1.6,-4) P12(2.4,-4) P13(3.2,-4) P14(4,-4) P15(4.8,-4) P16(5.6,-4) P17(6.4,-4) R1(-6.4,-4.8) R2(-5.6,-4.8) R3(-4.8,-4.8) R4(-4,-4.8) R5(-3.2,-4.8) R6(-2.4,-4.8) R7(-1.6,-4.8) R8(-0.8,-4.8) R9(0,-4.8) R10(0.8,-4.8) R11(1.6,-4.8) R12(2.4,-4.8) R13(3.2,-4.8) R14(4,-4.8) R15(4.8,-4.8) R16(5.6,-4.8) R17(6.4,-4.8) T1(-6.4,-5.6) T2(-5.6,-5.6) T3(-4.8,-5.6) T4(-4,-5.6) T5(-3.2,-5.6) T6(-2.4,-5.6) T7(-1.6,-5.6) T8(-0.8,-5.6) T9(0,-5.6) T10(0.8,-5.6) T11(1.6,-5.6) T12(2.4,-5.6) T13(3.2,-5.6) T14(4,-5.6) T15(4.8,-5.6) T16(5.6,-5.6) T17(6.4,-5.6) U1(-6.4,-6.4) U2(-5.6,-6.4) U3(-4.8,-6.4) U4(-4,-6.4) U5(-3.2,-6.4) U6(-2.4,-6.4) U7(-1.6,-6.4) U8(-0.8,-6.4) U9(0,-6.4) U10(0.8,-6.4) U11(1.6,-6.4) U12(2.4,-6.4) U13(3.2,-6.4) U14(4,-6.4) U15(4.8,-6.4) U16(5.6,-6.4) U17(6.4,-6.4)
Top Overlay:
  circle w0.25: c-7.65,6.4 r0.125
  region: -6.649,7 -7,6.649 -7,7
  lines w0.2: -7,6.649 -6.649,7 ; -7,-7 7,-7 7,7 -7,7 -7,-7
Mechanical 13:
  lines w0.1: -7,-7 7,-7 7,7 -7,7 -7,-7
Mechanical 15:
  lines w0.1: -0.5,0 0.5,0 ; 0,-0.5 0,0.5 ; -8,-8 8,-8 8,8 -8,8 -8,-8
3D body: height 1.37, standoff 0.3, extent -7,-7 7,7

## MARKER-C [mm]
pads (1):
  round 1 smd paste-1.016 mask+0.5: 0(0,0)
Top Layer:
  pour cut-out: -1.109,0 -1.072,-0.287 -0.961,-0.555 -0.785,-0.785 -0.555,-0.961 -0.287,-1.072 0,-1.109 0.287,-1.072 0.555,-0.961 0.785,-0.785 0.961,-0.555 1.072,-0.287 1.109,0 1.072,0.287 0.961,0.555 0.785,0.785 0.555,0.961 0.287,1.072 0,1.109 -0.287,1.072 -0.555,0.961 -0.785,0.785 -0.961,0.555 -1.072,0.287

## MB6S [mil]
height 78.74
pads (4):
  rect 60x25 smd: 1(-230,100) 2(-230,-20) 3(30,-20) 4(30,100)
Top Overlay:
  lines w10: -195,-45 -100,-45 -5,-45 -5,120 -195,120 -195,-45

## MIC [mil]
pads (2):
  round 50 hole 32 mask+4: N(0,50)
  rect 50x50 / inner round 50 / far side rect 50x50 hole 32 mask+4: P(0,-50)
Top Overlay:
  circle w8: c-58.28,-1.55 r192.91
3D body "CMB-6544PF.stp": height 275.59, standoff -185.04, extent -242.96,-186.2 127.12,183.88

## MIC-6022 [mm]
pads (2):
  rect 1x1 hole 0.5: 1(0,0)
  round 1 hole 0.5: 2(2,0)
Top Overlay:
  circle w0.254: c1.013,0.584 r3
  lines w0.254: -0.54,1.524 0.476,1.524 ; -0.032,1.016 -0.032,2.032

## MICRO-USB-SMD_MICRO-USB-A17 [mm]
pads (9):
  rect 1.6x0.4 smd paste-100 mask+0.051: 1(-1.435,-1.3) 2(-1.435,-0.65) 3(-1.435,0) 4(-1.435,0.65) 5(-1.435,1.3)
  oval 1.6x1 hole 0.55 slot 1.1 at 0 deg copper offset 0.001,0 paste+0 mask+0.051: 6(-1.725,-3.599)
  oval 1.6x1 hole 0.55 slot 1.1 at 0 deg copper offset -0.001,0 paste+0 mask+0.051: 7(-1.725,3.599)
  oval 2x1 hole 0.6 slot 1.5 at 0 deg copper offset -0.001,0.001 paste+0 mask+0.051: 8(1.724,3.599)
  oval 2x1 hole 0.6 slot 1.5 at 0 deg copper offset 0.001,0.001 paste+0 mask+0.051: 9(1.724,-3.599)
Top Overlay:
  lines w0.254: -2.136,-3.581 -2.136,-2.032 -1.018,-2.032 -1.018,-1.731 ; -2.136,3.607 -2.136,2.286 -1.018,2.286 -1.018,1.731 ; -2.125,-3.6 3.875,-3.6 3.875,3.6 -2.125,3.6
Top Paste:
  region: -2.025,-4.1 -2.124,-4.1 -2.308,-4.024 -2.449,-3.883 -2.525,-3.699 -2.525,-3.501 -2.449,-3.317 -2.308,-3.176 -2.124,-3.1 -2.025,-3.1 -1.425,-3.1 -1.326,-3.1 -1.142,-3.176 -1.001,-3.317 -0.925,-3.501 -0.925,-3.699 -1.001,-3.883 -1.142,-4.024 -1.326,-4.1 -1.425,-4.1
  region: -2.025,3.1 -2.124,3.1 -2.308,3.176 -2.449,3.317 -2.525,3.501 -2.525,3.699 -2.449,3.883 -2.308,4.024 -2.124,4.1 -2.025,4.1 -1.425,4.1 -1.326,4.1 -1.142,4.024 -1.001,3.883 -0.925,3.699 -0.925,3.501 -1.001,3.317 -1.142,3.176 -1.326,3.1 -1.425,3.1
  region: 1.225,3.1 1.126,3.1 0.942,3.176 0.801,3.317 0.725,3.501 0.725,3.699 0.801,3.883 0.942,4.024 1.126,4.1 1.225,4.1 2.225,4.1 2.324,4.1 2.508,4.024 2.649,3.883 2.725,3.699 2.725,3.501 2.649,3.317 2.508,3.176 2.324,3.1 2.225,3.1
  region: 1.225,-4.1 1.126,-4.1 0.942,-4.024 0.801,-3.883 0.725,-3.699 0.725,-3.501 0.801,-3.317 0.942,-3.176 1.126,-3.1 1.225,-3.1 2.225,-3.1 2.324,-3.1 2.508,-3.176 2.649,-3.317 2.725,-3.501 2.725,-3.699 2.649,-3.883 2.508,-4.024 2.324,-4.1 2.225,-4.1
  region: -2.235,-1.5 -2.235,-1.1 -0.635,-1.1 -0.635,-1.5
  region: -2.235,-0.85 -2.235,-0.45 -0.635,-0.45 -0.635,-0.85
  region: -2.235,-0.2 -2.235,0.2 -0.635,0.2 -0.635,-0.2
  region: -2.235,0.45 -2.235,0.85 -0.635,0.85 -0.635,0.45
  region: -2.235,1.1 -2.235,1.5 -0.635,1.5 -0.635,1.1
Keep-Out Layer:
  board cut-out: -0.125,2 -0.125,2.06 -0.171,2.17 -0.255,2.254 -0.365,2.3 -0.485,2.3 -0.595,2.254 -0.679,2.17 -0.725,2.06 -0.725,2 -0.725,1.94 -0.679,1.83 -0.595,1.746 -0.485,1.7 -0.365,1.7 -0.255,1.746 -0.171,1.83 -0.125,1.94 -0.125,2
  board cut-out: -0.125,-2 -0.125,-1.94 -0.171,-1.83 -0.255,-1.746 -0.365,-1.7 -0.485,-1.7 -0.595,-1.746 -0.679,-1.83 -0.725,-1.94 -0.725,-2 -0.725,-2.06 -0.679,-2.17 -0.595,-2.254 -0.485,-2.3 -0.365,-2.3 -0.255,-2.254 -0.171,-2.17 -0.125,-2.06 -0.125,-2
Mechanical 1:
  circle w0.005: c-0.425,2 r0.3
  circle w0.005: c-0.425,-2 r0.3
Mechanical 15:
  region: -2.065,-3.725 -2.065,-3.7 -2.1,-3.665 -2.15,-3.665 -2.185,-3.7 -2.185,-3.725 -2.185,-3.75 -2.15,-3.785 -2.1,-3.785 -2.065,-3.75 -2.065,-3.725
  region: -1.325,3.7 -1.325,3.45 -2.125,3.45 -2.125,3.7
  region: -1.325,-3.475 -1.325,-3.725 -2.125,-3.725 -2.125,-3.475
  region: 2.175,-3.475 2.175,-3.725 1.275,-3.725 1.275,-3.475
  region: 2.175,3.7 2.175,3.45 1.275,3.45 1.275,3.7
  region: -1.07,1.425 -1.07,1.175 -2.02,1.175 -2.02,1.425
  region: -1.07,0.775 -1.07,0.525 -2.02,0.525 -2.02,0.775
  region: -1.07,0.125 -1.07,-0.125 -2.02,-0.125 -2.02,0.125
  region: -1.07,-0.525 -1.07,-0.775 -2.02,-0.775 -2.02,-0.525
  region: -1.07,-1.175 -1.07,-1.425 -2.02,-1.425 -2.02,-1.175
  lines w0.051: -2.125,-3.7 -2.125,3.7 3.875,3.7 3.875,-3.7 -2.125,-3.7

## MicroSD [mm] "TF卡"
height 1.5
pads (15):
  rect 1.6x0.7 smd: 1(-11.008,2.25) 2(-11.008,1.15) 3(-11.008,0.05) 4(-11.008,-1.05) 5(-11.008,-2.15) 6(-11.008,-3.25) 7(-11.008,-4.35) 8(-11.008,-5.45) 9(-11.008,-6.55)
  rect 1.4x1.2 smd: 10(-10,-8.004)
  rect 2.2x1.7 smd: 11(-0.4,-7.75) 13(-0.4,7.75)
  rect 1.4x1.8 smd: 12(-10,6.85)
  round 0 hole 1: ""(0,-4.925) ""(0,3.05)
Top Overlay:
  lines w0.2: -10.5,2.88 -10.5,5.756 ; -9.144,-7.4 -1.778,-7.4 ; -9.144,7.4 -1.778,7.4 ; 0.762,-7.4 3.3,-7.4 3.3,1.016 ; 0.762,7.4 4,7.4 4,4.318 ccw(c5.69,2.628) 3.3,2.628 3.3,0.762
Mechanical 15:
  lines w0.1: -0.5,0 0.5,0 ; 0,-0.5 0,0.5 ; -11.938,-8.89 4.572,-8.89 4.572,8.89 -11.938,8.89 -11.938,-8.89
3D body "User Library-MEM2055-00-190-01-A_revG.step": height 1.95, standoff -0.5, extent -11.325,-8.025 3.925,7.975

## MicroUSB [mm]
pads (11):
  rect 0.4x2.1 smd: 1(2.6,0) 2(1.95,0) 3(1.3,0) 4(0.65,0) 5(0,0)
  round 1.2 hole 0.7: 6(-1.125,0) 7(3.725,0)
  rrect50% 1.2x1.8 hole 0.7 slot 1.1 at 90 deg: 8(-2.325,2.65) 9(4.925,2.65)
  rect 1x2.5 smd: 9(-0.425,3) 9(3,3)
3D body "User Library-Micro USB.x_b": height 2.77, standoff -0.17, extent -2.69,-0.225 5.29,5.205

## MKDSN_3RMI [mil]
pads (3):
  oct 80x80 hole 52: 1(0,0)
  round 80 hole 52: 2(200,0) 3(400,0)
Top Overlay:
  lines w8: -100,-138.33 500,-138.33 ; -100,-63.33 500,-63.33 ; -100,61.67 500,61.67 ; -100,83.33 500,83.33 ; -75,158.33 -50,108.33 -50,83.33 ; 50,83.33 50,108.33 75,158.33 ; 125,158.33 150,108.33 150,83.33 ; 250,83.33 250,108.33 275,158.33 ; 325,158.33 350,108.33 350,83.33 ; 450,83.33 450,108.33 475,158.33 ; -100,-163.33 500,-163.33 500,161.67 -100,161.67 -100,-163.33

## MPXGMF [mm] "MPXGMF"
height 12
pads (2):
  round 1.2 hole 0.635: 1(-5.08,0) 2(5.08,0)
Top Overlay:
  lines w0.254: -6.477,-2.54 6.35,-2.54 6.477,-2.413 6.477,2.54 -6.477,2.54 -6.477,-2.54